# Altium footprint library EwgMicrochips.PcbLib: 61 footprints (part 3 of 4)
Each footprint in its own frame and in the unit in brackets; x right, y up, seen from the top. Pads: shape width x height; smd on the part's side, far side on the other; paste and mask are expansions set on the pad; w line width, h text height; cw(c..) or ccw(c..) is an arc to the next point about the centre after c.
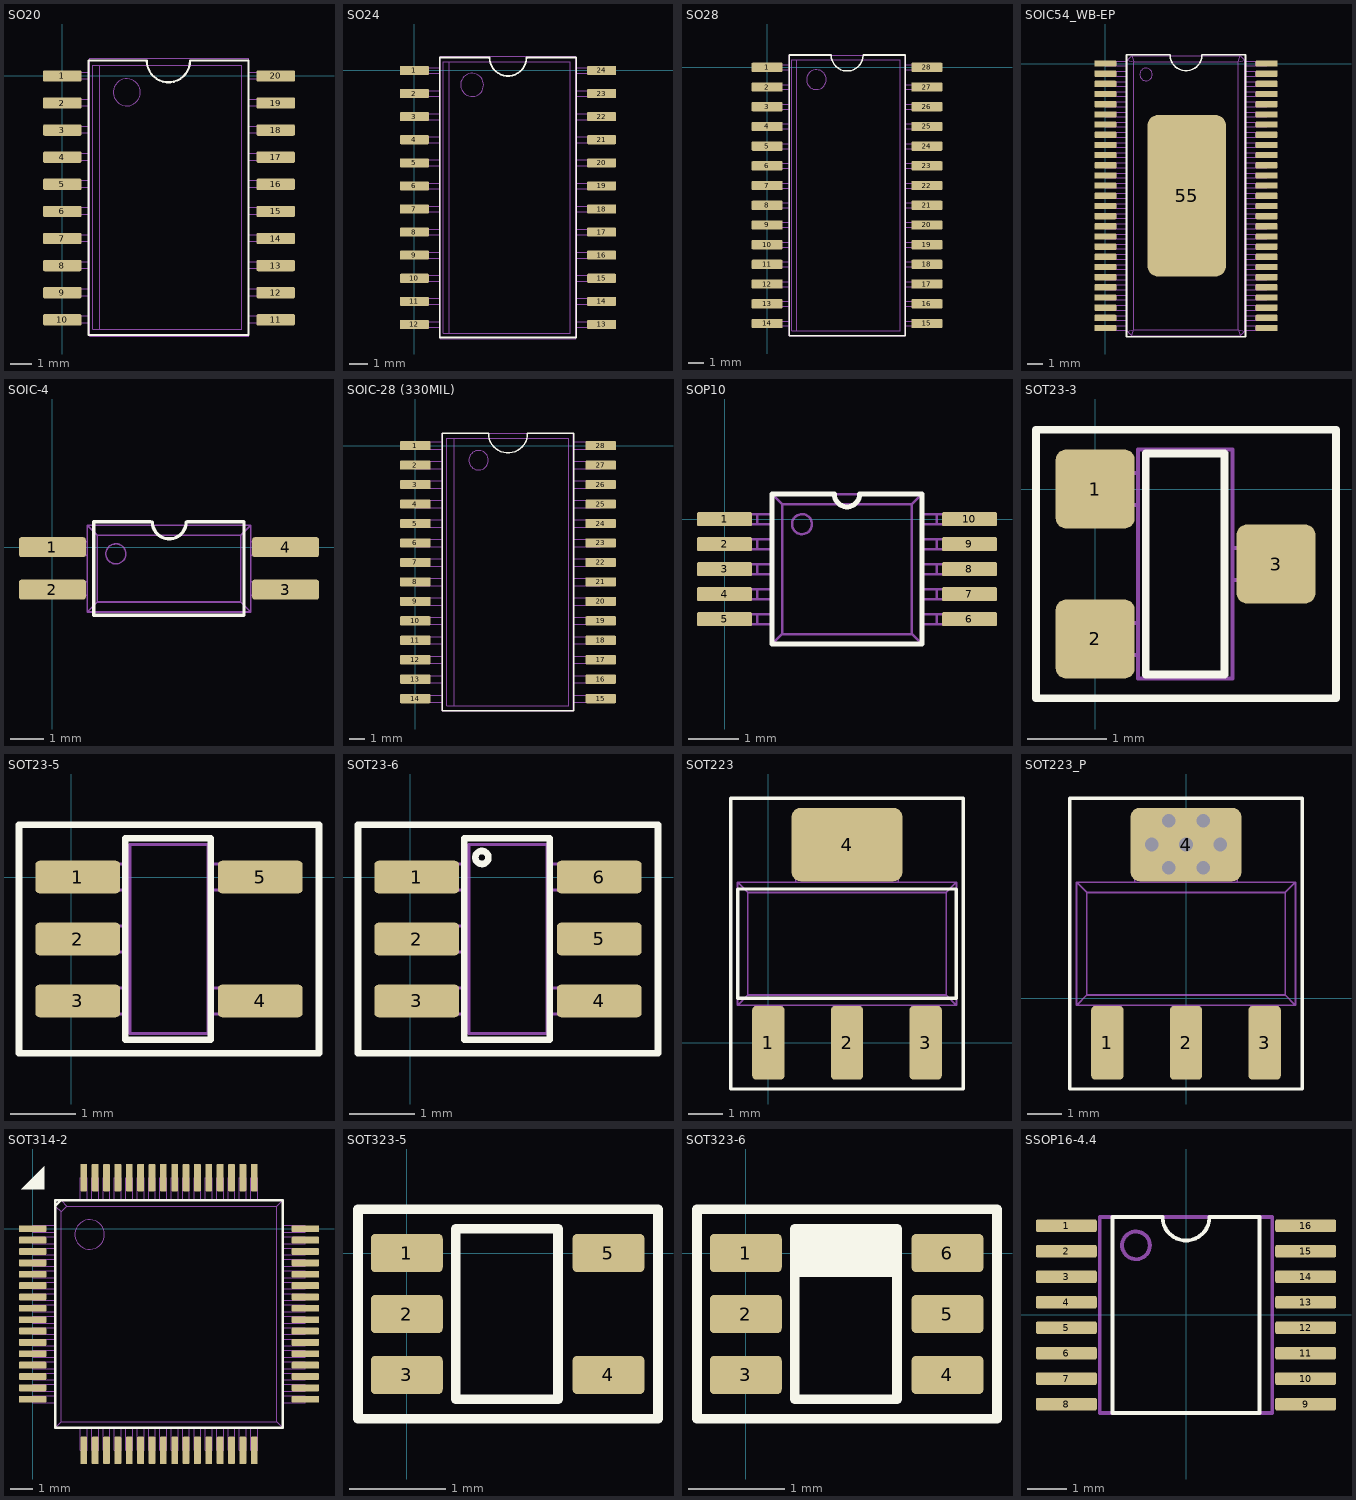
[diagram p2: the footprints below, top view; thin cyan lines are the x and y axes]

## SO20 [mm]
pads (20):
  rrect25% 1.8x0.53 smd: 1(0,0) 2(0,-1.27) 3(0,-2.54) 4(0,-3.81) 5(0,-5.08) 6(0,-6.35) 7(0,-7.62) 8(0,-8.89) 9(0,-10.16) 10(0,-11.43) 11(10,-11.43) 12(10,-10.16) 13(10,-8.89) 14(10,-7.62) 15(10,-6.35) 16(10,-5.08) 17(10,-3.81) 18(10,-2.54) 19(10,-1.27) 20(10,0)
Top Overlay:
  lines w0.1: 1.222,-12.145 8.722,-12.145 8.722,0.715 5.988,0.715 cw(c4.972,0.715) 3.956,0.715 1.222,0.715 1.222,-12.145
Mechanical 1:
  circle w0.05: c3.023,-0.768 r0.635
  lines w0.05: 0.483,-11.563 0.483,-11.246 ; 0.483,-10.293 0.483,-9.976 ; 0.483,-9.023 0.483,-8.706 ; 0.483,-7.753 0.483,-7.436 ; 0.483,-6.483 0.483,-6.166 ; 0.483,-5.213 0.483,-4.896 ; 0.483,-3.943 0.483,-3.626 ; 0.483,-2.673 0.483,-2.356 ; 0.483,-1.403 0.483,-1.086 ; 0.483,-0.133 0.483,0.184 ; 1.276,-11.563 -0.152,-11.563 -0.152,-11.246 1.276,-11.246 ; 1.276,-10.293 -0.152,-10.293 -0.152,-9.976 1.276,-9.976 ; 1.276,-9.023 -0.152,-9.023 -0.152,-8.706 1.276,-8.706 ; 1.276,-7.753 -0.152,-7.753 -0.152,-7.436 1.276,-7.436 ; 1.276,-6.483 -0.152,-6.483 -0.152,-6.166 1.276,-6.166 ; 1.276,-5.213 -0.152,-5.213 -0.152,-4.896 1.276,-4.896 ; 1.276,-3.943 -0.152,-3.943 -0.152,-3.626 1.276,-3.626 ; 1.276,-2.673 -0.152,-2.673 -0.152,-2.356 1.276,-2.356 ; 1.276,-1.403 -0.152,-1.403 -0.152,-1.086 1.276,-1.086 ; 1.276,-0.133 -0.152,-0.133 -0.152,0.184 1.276,0.184 ; 1.753,-11.881 1.753,0.502 ; 8.738,-11.563 10.166,-11.563 10.166,-11.246 8.738,-11.246 ; 8.738,-10.293 10.166,-10.293 10.166,-9.976 8.738,-9.976 ; 8.738,-9.023 10.166,-9.023 10.166,-8.706 8.738,-8.706 ; 8.738,-7.753 10.166,-7.753 10.166,-7.436 8.738,-7.436 ; 8.738,-6.483 10.166,-6.483 10.166,-6.166 8.738,-6.166 ; 8.738,-5.213 10.166,-5.213 10.166,-4.896 8.738,-4.896 ; 8.738,-3.943 10.166,-3.943 10.166,-3.626 8.738,-3.626 ; 8.738,-2.673 10.166,-2.673 10.166,-2.356 8.738,-2.356 ; 8.738,-1.403 10.166,-1.403 10.166,-1.086 8.738,-1.086 ; 8.738,-0.133 10.166,-0.133 10.166,0.184 8.738,0.184 ; 9.531,-11.563 9.531,-11.246 ; 9.531,-10.293 9.531,-9.976 ; 9.531,-9.023 9.531,-8.706 ; 9.531,-7.753 9.531,-7.436 ; 9.531,-6.483 9.531,-6.166 ; 9.531,-5.213 9.531,-4.896 ; 9.531,-3.943 9.531,-3.626 ; 9.531,-2.673 9.531,-2.356 ; 9.531,-1.403 9.531,-1.086 ; 9.531,-0.133 9.531,0.184 ; 1.276,-12.198 8.738,-12.198 8.738,0.819 1.276,0.819 1.276,-12.198 ; 1.435,-11.881 8.42,-11.881 8.42,0.502 1.435,0.502 1.435,-11.881
3D body: height 2.7, standoff 0, extent -0.172,-12.114 10.128,0.686

## SO24 [mm]
pads (24):
  rrect25% 1.6x0.5 smd: 1(0,0) 2(0,-1.27) 3(0,-2.54) 4(0,-3.81) 5(0,-5.08) 6(0,-6.35) 7(0,-7.62) 8(0,-8.89) 9(0,-10.16) 10(0,-11.43) 11(0,-12.7) 12(0,-13.97) 13(10.3,-13.97) 14(10.3,-12.7) 15(10.3,-11.43) 16(10.3,-10.16) 17(10.3,-8.89) 18(10.3,-7.62) 19(10.3,-6.35) 20(10.3,-5.08) 21(10.3,-3.81) 22(10.3,-2.54) 23(10.3,-1.27) 24(10.3,0)
Top Overlay:
  lines w0.1: 1.4,-14.685 1.4,0.715 4.134,0.715 ccw(c5.15,0.715) 6.166,0.715 8.9,0.715 8.9,-14.685 1.4,-14.685
Mechanical 1:
  circle w0.05: c3.175,-0.794 r0.635
  lines w0.05: 0.635,-14.129 0.635,-13.811 ; 0.635,-12.859 0.635,-12.541 ; 0.635,-11.589 0.635,-11.271 ; 0.635,-10.319 0.635,-10.001 ; 0.635,-9.049 0.635,-8.731 ; 0.635,-7.779 0.635,-7.461 ; 0.635,-6.509 0.635,-6.191 ; 0.635,-5.239 0.635,-4.921 ; 0.635,-3.969 0.635,-3.651 ; 0.635,-2.699 0.635,-2.381 ; 0.635,-1.429 0.635,-1.111 ; 0.635,-0.159 0.635,0.159 ; 1.429,-14.129 0,-14.129 0,-13.811 1.429,-13.811 ; 1.429,-12.859 0,-12.859 0,-12.541 1.429,-12.541 ; 1.429,-11.589 0,-11.589 0,-11.271 1.429,-11.271 ; 1.429,-10.319 0,-10.319 0,-10.001 1.429,-10.001 ; 1.429,-9.049 0,-9.049 0,-8.731 1.429,-8.731 ; 1.429,-7.779 0,-7.779 0,-7.461 1.429,-7.461 ; 1.429,-6.509 0,-6.509 0,-6.191 1.429,-6.191 ; 1.429,-5.239 0,-5.239 0,-4.921 1.429,-4.921 ; 1.429,-3.969 0,-3.969 0,-3.651 1.429,-3.651 ; 1.429,-2.699 0,-2.699 0,-2.381 1.429,-2.381 ; 1.429,-1.429 0,-1.429 0,-1.111 1.429,-1.111 ; 1.429,-0.159 0,-0.159 0,0.159 1.429,0.159 ; 1.905,-14.446 1.905,0.476 ; 8.89,-14.129 10.319,-14.129 10.319,-13.811 8.89,-13.811 ; 8.89,-12.859 10.319,-12.859 10.319,-12.541 8.89,-12.541 ; 8.89,-11.589 10.319,-11.589 10.319,-11.271 8.89,-11.271 ; 8.89,-10.319 10.319,-10.319 10.319,-10.001 8.89,-10.001 ; 8.89,-9.049 10.319,-9.049 10.319,-8.731 8.89,-8.731 ; 8.89,-7.779 10.319,-7.779 10.319,-7.461 8.89,-7.461 ; 8.89,-6.509 10.319,-6.509 10.319,-6.191 8.89,-6.191 ; 8.89,-5.239 10.319,-5.239 10.319,-4.921 8.89,-4.921 ; 8.89,-3.969 10.319,-3.969 10.319,-3.651 8.89,-3.651 ; 8.89,-2.699 10.319,-2.699 10.319,-2.381 8.89,-2.381 ; 8.89,-1.429 10.319,-1.429 10.319,-1.111 8.89,-1.111 ; 8.89,-0.159 10.319,-0.159 10.319,0.159 8.89,0.159 ; 9.684,-14.129 9.684,-13.811 ; 9.684,-12.859 9.684,-12.541 ; 9.684,-11.589 9.684,-11.271 ; 9.684,-10.319 9.684,-10.001 ; 9.684,-9.049 9.684,-8.731 ; 9.684,-7.779 9.684,-7.461 ; 9.684,-6.509 9.684,-6.191 ; 9.684,-5.239 9.684,-4.921 ; 9.684,-3.969 9.684,-3.651 ; 9.684,-2.699 9.684,-2.381 ; 9.684,-1.429 9.684,-1.111 ; 9.684,-0.159 9.684,0.159 ; 1.429,-14.764 1.429,0.794 8.89,0.794 8.89,-14.764 1.429,-14.764 ; 1.587,-14.446 1.587,0.476 8.572,0.476 8.572,-14.446 1.587,-14.446
3D body: height 2.6, standoff 0, extent -0.025,-14.8 10.375,0.6

## SO28 [mm]
pads (28):
  rrect25% 2x0.6 smd: 1(0,0) 2(0,-1.27) 3(0,-2.54) 4(0,-3.81) 5(0,-5.08) 6(0,-6.35) 7(0,-7.62) 8(0,-8.89) 9(0,-10.16) 10(0,-11.43) 11(0,-12.7) 12(0,-13.97) 13(0,-15.24) 14(0,-16.51) 15(10.3,-16.51) 16(10.3,-15.24) 17(10.3,-13.97) 18(10.3,-12.7) 19(10.3,-11.43) 20(10.3,-10.16) 21(10.3,-8.89) 22(10.3,-7.62) 23(10.3,-6.35) 24(10.3,-5.08) 25(10.3,-3.81) 26(10.3,-2.54) 27(10.3,-1.27) 28(10.3,0)
Top Overlay:
  lines w0.1: 1.429,-17.304 1.429,0.794 4.127,0.794 ccw(c5.159,0.794) 6.191,0.794 8.89,0.794 8.89,-17.304 1.429,-17.304
Mechanical 1:
  circle w0.05: c3.175,-0.794 r0.635
  lines w0.05: 0.635,-16.669 0.635,-16.351 ; 0.635,-15.399 0.635,-15.081 ; 0.635,-14.129 0.635,-13.811 ; 0.635,-12.859 0.635,-12.541 ; 0.635,-11.589 0.635,-11.271 ; 0.635,-10.319 0.635,-10.001 ; 0.635,-9.049 0.635,-8.731 ; 0.635,-7.779 0.635,-7.461 ; 0.635,-6.509 0.635,-6.191 ; 0.635,-5.239 0.635,-4.921 ; 0.635,-3.969 0.635,-3.651 ; 0.635,-2.699 0.635,-2.381 ; 0.635,-1.429 0.635,-1.111 ; 0.635,-0.159 0.635,0.159 ; 1.429,-16.669 0,-16.669 0,-16.351 1.429,-16.351 ; 1.429,-15.399 0,-15.399 0,-15.081 1.429,-15.081 ; 1.429,-14.129 0,-14.129 0,-13.811 1.429,-13.811 ; 1.429,-12.859 0,-12.859 0,-12.541 1.429,-12.541 ; 1.429,-11.589 0,-11.589 0,-11.271 1.429,-11.271 ; 1.429,-10.319 0,-10.319 0,-10.001 1.429,-10.001 ; 1.429,-9.049 0,-9.049 0,-8.731 1.429,-8.731 ; 1.429,-7.779 0,-7.779 0,-7.461 1.429,-7.461 ; 1.429,-6.509 0,-6.509 0,-6.191 1.429,-6.191 ; 1.429,-5.239 0,-5.239 0,-4.921 1.429,-4.921 ; 1.429,-3.969 0,-3.969 0,-3.651 1.429,-3.651 ; 1.429,-2.699 0,-2.699 0,-2.381 1.429,-2.381 ; 1.429,-1.429 0,-1.429 0,-1.111 1.429,-1.111 ; 1.429,-0.159 0,-0.159 0,0.159 1.429,0.159 ; 1.905,-16.986 1.905,0.476 ; 8.89,-16.669 10.319,-16.669 10.319,-16.351 8.89,-16.351 ; 8.89,-15.399 10.319,-15.399 10.319,-15.081 8.89,-15.081 ; 8.89,-14.129 10.319,-14.129 10.319,-13.811 8.89,-13.811 ; 8.89,-12.859 10.319,-12.859 10.319,-12.541 8.89,-12.541 ; 8.89,-11.589 10.319,-11.589 10.319,-11.271 8.89,-11.271 ; 8.89,-10.319 10.319,-10.319 10.319,-10.001 8.89,-10.001 ; 8.89,-9.049 10.319,-9.049 10.319,-8.731 8.89,-8.731 ; 8.89,-7.779 10.319,-7.779 10.319,-7.461 8.89,-7.461 ; 8.89,-6.509 10.319,-6.509 10.319,-6.191 8.89,-6.191 ; 8.89,-5.239 10.319,-5.239 10.319,-4.921 8.89,-4.921 ; 8.89,-3.969 10.319,-3.969 10.319,-3.651 8.89,-3.651 ; 8.89,-2.699 10.319,-2.699 10.319,-2.381 8.89,-2.381 ; 8.89,-1.429 10.319,-1.429 10.319,-1.111 8.89,-1.111 ; 8.89,-0.159 10.319,-0.159 10.319,0.159 8.89,0.159 ; 9.684,-16.669 9.684,-16.351 ; 9.684,-15.399 9.684,-15.081 ; 9.684,-14.129 9.684,-13.811 ; 9.684,-12.859 9.684,-12.541 ; 9.684,-11.589 9.684,-11.271 ; 9.684,-10.319 9.684,-10.001 ; 9.684,-9.049 9.684,-8.731 ; 9.684,-7.779 9.684,-7.461 ; 9.684,-6.509 9.684,-6.191 ; 9.684,-5.239 9.684,-4.921 ; 9.684,-3.969 9.684,-3.651 ; 9.684,-2.699 9.684,-2.381 ; 9.684,-1.429 9.684,-1.111 ; 9.684,-0.159 9.684,0.159 ; 1.429,-17.304 1.429,0.794 8.89,0.794 8.89,-17.304 1.429,-17.304 ; 1.587,-16.986 1.587,0.476 8.572,0.476 8.572,-16.986 1.587,-16.986

## SOIC54_WB-EP [mm]
pads (55):
  rrect25% 1.4x0.4 smd: 1(0,0) 2(0,-0.65) 3(0,-1.3) 4(0,-1.95) 5(0,-2.6) 6(0,-3.25) 7(0,-3.9) 8(0,-4.55) 9(0,-5.2) 10(0,-5.85) 11(0,-6.5) 12(0,-7.15) 13(0,-7.8) 14(0,-8.45) 15(0,-9.1) 16(0,-9.75) 17(0,-10.4) 18(0,-11.05) 19(0,-11.7) 20(0,-12.35) 21(0,-13) 22(0,-13.65) 23(0,-14.3) 24(0,-14.95) 25(0,-15.6) 26(0,-16.25) 27(0,-16.9) 28(10.3,-16.9) 29(10.3,-16.25) 30(10.3,-15.6) 31(10.3,-14.95) 32(10.3,-14.3) 33(10.3,-13.65) 34(10.3,-13) 35(10.3,-12.35) 36(10.3,-11.7) 37(10.3,-11.05) 38(10.3,-10.4) 39(10.3,-9.75) 40(10.3,-9.1) 41(10.3,-8.45) 42(10.3,-7.8) 43(10.3,-7.15) 44(10.3,-6.5) 45(10.3,-5.85) 46(10.3,-5.2) 47(10.3,-4.55) 48(10.3,-3.9) 49(10.3,-3.25) 50(10.3,-2.6) 51(10.3,-1.95) 52(10.3,-1.3) 53(10.3,-0.65) 54(10.3,0)
  rrect25% 5x10.3 smd: 55(5.2,-8.45)
Top Overlay:
  lines w0.1: 1.35,-17.45 8.95,-17.45 8.95,0.55 6.166,0.55 cw(c5.15,0.55) 4.134,0.55 1.35,0.55 1.35,-17.45
Mechanical 1:
  drawing of 238 lines, arcs and shapes, not listed

## SOIC-4 [mm]
pads (4):
  rrect25% 2x0.6 smd: 1(0,0) 2(0,-1.27) 3(6.985,-1.27) 4(6.985,0)
Top Overlay:
  lines w0.1: 2.94,0.76 1.24,0.76 1.24,-2.04 5.74,-2.04 5.74,0.76 4.04,0.76 ; 2.992,0.755 ccw(c3.5,0.755) 4.008,0.755
Mechanical 1:
  circle w0.05: c1.9,-0.2 r0.3
  lines w0.05: 0.54,-1.44 0.54,-1.04 ; 0.54,-0.24 0.54,0.16 ; 1.04,-1.44 -0.06,-1.44 -0.06,-1.04 1.04,-1.04 ; 1.04,-0.24 -0.06,-0.24 -0.06,0.16 1.04,0.16 ; 5.94,-1.44 7.04,-1.44 7.04,-1.04 5.94,-1.04 ; 5.94,-0.24 7.04,-0.24 7.04,0.16 5.94,0.16 ; 6.44,-1.44 6.44,-1.04 ; 6.44,-0.24 6.44,0.16 ; 1.04,-1.94 1.04,0.66 ; 1.04,-1.94 1.34,-1.64 ; 1.04,-1.94 5.94,-1.94 ; 1.04,0.66 1.34,0.36 ; 1.04,0.66 5.94,0.66 ; 1.34,-1.64 1.34,0.36 ; 1.34,-1.64 5.64,-1.64 ; 1.34,0.36 5.64,0.36 ; 5.64,-1.64 5.64,0.36 ; 5.64,-1.64 5.94,-1.94 ; 5.64,0.36 5.94,0.66 ; 5.94,-1.94 5.94,0.66
3D body: height 1.7, standoff -0.05, extent 0.4,-1.85 6.6,0.5

## SOIC-28 (330MIL) [mm]
pads (28):
  rrect25% 2x0.6 smd: 1(0,0) 2(0,-1.27) 3(0,-2.54) 4(0,-3.81) 5(0,-5.08) 6(0,-6.35) 7(0,-7.62) 8(0,-8.89) 9(0,-10.16) 10(0,-11.43) 11(0,-12.7) 12(0,-13.97) 13(0,-15.24) 14(0,-16.51) 15(12.1,-16.51) 16(12.1,-15.24) 17(12.1,-13.97) 18(12.1,-12.7) 19(12.1,-11.43) 20(12.1,-10.16) 21(12.1,-8.89) 22(12.1,-7.62) 23(12.1,-6.35) 24(12.1,-5.08) 25(12.1,-3.81) 26(12.1,-2.54) 27(12.1,-1.27) 28(12.1,0)
Top Overlay:
  lines w0.1: 1.775,-17.305 10.325,-17.305 10.325,0.795 7.32,0.795 cw(c6.05,0.795) 4.78,0.795 1.775,0.795 1.775,-17.305
Mechanical 1:
  circle w0.05: c4.127,-0.953 r0.635
  lines w0.05: 0.873,-16.748 0.873,-16.272 ; 0.873,-15.478 0.873,-15.002 ; 0.873,-14.208 0.873,-13.732 ; 0.873,-12.938 0.873,-12.462 ; 0.873,-11.668 0.873,-11.192 ; 0.873,-10.398 0.873,-9.922 ; 0.873,-9.128 0.873,-8.652 ; 0.873,-7.858 0.873,-7.382 ; 0.873,-6.588 0.873,-6.112 ; 0.873,-5.318 0.873,-4.842 ; 0.873,-4.048 0.873,-3.572 ; 0.873,-2.778 0.873,-2.302 ; 0.873,-1.508 0.873,-1.032 ; 0.873,-0.238 0.873,0.238 ; 1.746,-16.748 0,-16.748 0,-16.272 1.746,-16.272 ; 1.746,-15.478 0,-15.478 0,-15.002 1.746,-15.002 ; 1.746,-14.208 0,-14.208 0,-13.732 1.746,-13.732 ; 1.746,-12.938 0,-12.938 0,-12.462 1.746,-12.462 ; 1.746,-11.668 0,-11.668 0,-11.192 1.746,-11.192 ; 1.746,-10.398 0,-10.398 0,-9.922 1.746,-9.922 ; 1.746,-9.128 0,-9.128 0,-8.652 1.746,-8.652 ; 1.746,-7.858 0,-7.858 0,-7.382 1.746,-7.382 ; 1.746,-6.588 0,-6.588 0,-6.112 1.746,-6.112 ; 1.746,-5.318 0,-5.318 0,-4.842 1.746,-4.842 ; 1.746,-4.048 0,-4.048 0,-3.572 1.746,-3.572 ; 1.746,-2.778 0,-2.778 0,-2.302 1.746,-2.302 ; 1.746,-1.508 0,-1.508 0,-1.032 1.746,-1.032 ; 1.746,-0.238 0,-0.238 0,0.238 1.746,0.238 ; 2.54,-16.986 2.54,0.476 ; 10.319,-16.748 12.066,-16.748 12.066,-16.272 10.319,-16.272 ; 10.319,-15.478 12.066,-15.478 12.066,-15.002 10.319,-15.002 ; 10.319,-14.208 12.066,-14.208 12.066,-13.732 10.319,-13.732 ; 10.319,-12.938 12.066,-12.938 12.066,-12.462 10.319,-12.462 ; 10.319,-11.668 12.066,-11.668 12.066,-11.192 10.319,-11.192 ; 10.319,-10.398 12.066,-10.398 12.066,-9.922 10.319,-9.922 ; 10.319,-9.128 12.066,-9.128 12.066,-8.652 10.319,-8.652 ; 10.319,-7.858 12.066,-7.858 12.066,-7.382 10.319,-7.382 ; 10.319,-6.588 12.066,-6.588 12.066,-6.112 10.319,-6.112 ; 10.319,-5.318 12.066,-5.318 12.066,-4.842 10.319,-4.842 ; 10.319,-4.048 12.066,-4.048 12.066,-3.572 10.319,-3.572 ; 10.319,-2.778 12.066,-2.778 12.066,-2.302 10.319,-2.302 ; 10.319,-1.508 12.066,-1.508 12.066,-1.032 10.319,-1.032 ; 10.319,-0.238 12.066,-0.238 12.066,0.238 10.319,0.238 ; 11.193,-16.748 11.193,-16.272 ; 11.193,-15.478 11.193,-15.002 ; 11.193,-14.208 11.193,-13.732 ; 11.193,-12.938 11.193,-12.462 ; 11.193,-11.668 11.193,-11.192 ; 11.193,-10.398 11.193,-9.922 ; 11.193,-9.128 11.193,-8.652 ; 11.193,-7.858 11.193,-7.382 ; 11.193,-6.588 11.193,-6.112 ; 11.193,-5.318 11.193,-4.842 ; 11.193,-4.048 11.193,-3.572 ; 11.193,-2.778 11.193,-2.302 ; 11.193,-1.508 11.193,-1.032 ; 11.193,-0.238 11.193,0.238 ; 1.746,-17.304 10.319,-17.304 10.319,0.794 1.746,0.794 1.746,-17.304 ; 2.064,-16.986 10.001,-16.986 10.001,0.476 2.064,0.476 2.064,-16.986

## SOP10 [mm]
pads (10):
  rrect25% 1.1x0.28 smd: 1(0,0) 2(0,-0.5) 3(0,-1) 4(0,-1.5) 5(0,-2) 6(4.9,-2) 7(4.9,-1.5) 8(4.9,-1) 9(4.9,-0.5) 10(4.9,0)
Top Overlay:
  lines w0.1: 0.95,-2.5 0.95,0.5 2.196,0.5 ccw(c2.45,0.5) 2.704,0.5 3.95,0.5 3.95,-2.5 0.95,-2.5
Mechanical 1:
  circle w0.05: c1.55,-0.1 r0.2
  lines w0.05: 0.25,-2.1 0.25,-1.9 ; 0.25,-1.6 0.25,-1.4 ; 0.25,-1.1 0.25,-0.9 ; 0.25,-0.6 0.25,-0.4 ; 0.25,-0.1 0.25,0.1 ; 0.65,-2.1 0.65,-1.9 ; 0.65,-1.6 0.65,-1.4 ; 0.65,-1.1 0.65,-0.9 ; 0.65,-0.6 0.65,-0.4 ; 0.65,-0.1 0.65,0.1 ; 0.95,-2.1 -0.05,-2.1 -0.05,-1.9 0.95,-1.9 ; 0.95,-1.6 -0.05,-1.6 -0.05,-1.4 0.95,-1.4 ; 0.95,-1.1 -0.05,-1.1 -0.05,-0.9 0.95,-0.9 ; 0.95,-0.6 -0.05,-0.6 -0.05,-0.4 0.95,-0.4 ; 0.95,-0.1 -0.05,-0.1 -0.05,0.1 0.95,0.1 ; 3.95,-2.1 4.95,-2.1 4.95,-1.9 3.95,-1.9 ; 3.95,-1.6 4.95,-1.6 4.95,-1.4 3.95,-1.4 ; 3.95,-1.1 4.95,-1.1 4.95,-0.9 3.95,-0.9 ; 3.95,-0.6 4.95,-0.6 4.95,-0.4 3.95,-0.4 ; 3.95,-0.1 4.95,-0.1 4.95,0.1 3.95,0.1 ; 4.25,-2.1 4.25,-1.9 ; 4.25,-1.6 4.25,-1.4 ; 4.25,-1.1 4.25,-0.9 ; 4.25,-0.6 4.25,-0.4 ; 4.25,-0.1 4.25,0.1 ; 4.65,-2.1 4.65,-1.9 ; 4.65,-1.6 4.65,-1.4 ; 4.65,-1.1 4.65,-0.9 ; 4.65,-0.6 4.65,-0.4 ; 4.65,-0.1 4.65,0.1 ; 0.95,-2.5 1.15,-2.3 ; 0.95,-2.5 0.95,0.5 ; 0.95,-2.5 3.95,-2.5 ; 0.95,0.5 1.15,0.3 ; 0.95,0.5 3.95,0.5 ; 1.15,-2.3 1.15,0.3 ; 1.15,-2.3 3.75,-2.3 ; 1.15,0.3 3.75,0.3 ; 3.75,-2.3 3.95,-2.5 ; 3.75,-2.3 3.75,0.3 ; 3.75,0.3 3.95,0.5 ; 3.95,-2.5 3.95,0.5

## SOT23-3 [mm]
pads (3):
  rrect25% 1x1 smd: 1(0,0) 2(0,-1.9) 3(2.29,-0.95)
Top Overlay:
  lines w0.1: -0.75,-2.65 -0.75,0.75 3.05,0.75 3.05,-2.65 -0.75,-2.65 ; 0.64,-2.35 1.64,-2.35 1.64,0.45 0.64,0.45 0.64,-2.35
Mechanical 1:
  lines w0.05: 0.24,-2.1 0.24,-1.7 ; 0.24,-0.2 0.24,0.2 ; 0.54,-2.1 0.04,-2.1 0.04,-1.7 0.54,-1.7 ; 0.54,-0.2 0.04,-0.2 0.04,0.2 0.54,0.2 ; 1.74,-1.15 2.24,-1.15 2.24,-0.75 1.74,-0.75 ; 2.04,-1.15 2.04,-0.75 ; 0.54,-2.4 1.74,-2.4 1.74,0.5 0.54,0.5 0.54,-2.4
3D body: height 0.97, standoff -0.01, extent -0.13,-2.435 2.418,0.485

## SOT23-5 [mm]
pads (5):
  rrect25% 1.3x0.5 smd mask+0.05: 1(0.1,0) 2(0.1,-0.95) 3(0.1,-1.9) 4(2.9,-1.9) 5(2.9,0)
Top Overlay:
  lines w0.1: -0.8,-2.7 3.8,-2.7 3.8,0.8 -0.8,0.8 -0.8,-2.7 ; 0.831,-2.494 0.831,0.594 2.137,0.594 2.137,-2.494 0.831,-2.494
Mechanical 1:
  lines w0.05: 0.596,-2.1 0.596,-1.7 ; 0.596,-1.15 0.596,-0.75 ; 0.596,-0.2 0.596,0.2 ; 0.896,-2.1 0.396,-2.1 0.396,-1.7 0.896,-1.7 ; 0.896,-1.15 0.396,-1.15 0.396,-0.75 0.896,-0.75 ; 0.896,-0.2 0.396,-0.2 0.396,0.2 0.896,0.2 ; 2.096,-2.1 2.596,-2.1 2.596,-1.7 2.096,-1.7 ; 2.096,-0.2 2.596,-0.2 2.596,0.2 2.096,0.2 ; 2.396,-2.1 2.396,-1.7 ; 2.396,-0.2 2.396,0.2 ; 0.896,-2.4 0.896,0.5 2.096,0.5 2.096,-2.4 0.896,-2.4
3D body: height 1.45, standoff -0.01, extent 0,-2.45 3,0.55

## SOT23-6 [mm]
pads (6):
  rrect25% 1.3x0.5 smd mask+0.05: 1(0.1,0) 2(0.1,-0.95) 3(0.1,-1.9) 4(2.9,-1.9) 5(2.9,-0.95) 6(2.9,0)
Top Overlay:
  circle w0.1: c1.1,0.3 r0.1
  lines w0.1: -0.8,-2.7 3.8,-2.7 3.8,0.8 -0.8,0.8 -0.8,-2.7 ; 0.831,-2.494 0.831,0.594 2.137,0.594 2.137,-2.494 0.831,-2.494
Mechanical 1:
  lines w0.05: 0.596,-2.1 0.596,-1.7 ; 0.596,-1.15 0.596,-0.75 ; 0.596,-0.2 0.596,0.2 ; 0.896,-2.1 0.396,-2.1 0.396,-1.7 0.896,-1.7 ; 0.896,-1.15 0.396,-1.15 0.396,-0.75 0.896,-0.75 ; 0.896,-0.2 0.396,-0.2 0.396,0.2 0.896,0.2 ; 2.096,-2.1 2.596,-2.1 2.596,-1.7 2.096,-1.7 ; 2.096,-0.2 2.596,-0.2 2.596,0.2 2.096,0.2 ; 2.396,-2.1 2.396,-1.7 ; 2.396,-0.2 2.396,0.2 ; 0.896,-2.4 0.896,0.5 2.096,0.5 2.096,-2.4 0.896,-2.4
3D body: height 1.4, standoff 0, extent -0.016,-2.494 2.984,0.554

## SOT223 [mm]
pads (4):
  rrect25% 0.95x2.15 smd: 1(0,0) 2(2.3,0) 3(4.6,0)
  rrect25% 3.25x2.15 smd: 4(2.3,5.8)
Top Overlay:
  lines w0.1: -1.1,-1.35 -1.1,7.15 5.7,7.15 5.7,-1.35 -1.1,-1.35 ; -0.9,1.3 5.5,1.3 5.5,4.5 -0.9,4.5 -0.9,1.3
Mechanical 1:
  lines w0.05: -0.4,0 0.4,0 ; -0.4,1.1 -0.4,-0.6 0.4,-0.6 0.4,1.1 ; 0.8,4.7 0.8,6.4 3.8,6.4 3.8,4.7 ; 0.8,5.6 3.8,5.6 ; 1.9,0 2.7,0 ; 1.9,1.1 1.9,-0.6 2.7,-0.6 2.7,1.1 ; 4.2,0 5,0 ; 4.2,1.1 4.2,-0.6 5,-0.6 5,1.1 ; -0.9,1.1 5.5,1.1 ; -0.9,1.1 -0.6,1.4 ; -0.9,1.1 -0.9,4.7 ; -0.9,4.7 5.5,4.7 ; -0.9,4.7 -0.6,4.4 ; -0.6,1.4 5.2,1.4 ; -0.6,1.4 -0.6,4.4 ; -0.6,4.4 5.2,4.4 ; 5.2,1.4 5.5,1.1 ; 5.2,1.4 5.2,4.4 ; 5.2,4.4 5.5,4.7 ; 5.5,1.1 5.5,4.7
3D body: height 1.64, standoff -0.01, extent -0.94,-0.6 5.56,6.4

## SOT223_P [mm]
pads (4):
  rrect25% 0.95x2.15 smd: 1(-2.3,-1.3) 2(0,-1.3) 3(2.3,-1.3)
  rrect25% 3.25x2.15 hole 0.4: 4(0,4.5)
via -0.5,3.825 diameter 0.7 hole 0.4
via 0.5,3.825 diameter 0.7 hole 0.4
via -1,4.5 diameter 0.7 hole 0.4
via 1,4.5 diameter 0.7 hole 0.4
via -0.5,5.2 diameter 0.7 hole 0.4
via 0.5,5.2 diameter 0.7 hole 0.4
Top Overlay:
  lines w0.1: -3.4,-2.65 -3.4,5.85 3.4,5.85 3.4,-2.65 -3.4,-2.65
Mechanical 1:
  lines w0.05: -2.7,-1.3 -1.9,-1.3 ; -2.7,-0.2 -2.7,-1.9 -1.9,-1.9 -1.9,-0.2 ; -1.5,3.4 -1.5,5.1 1.5,5.1 1.5,3.4 ; -1.5,4.3 1.5,4.3 ; -0.4,-1.3 0.4,-1.3 ; -0.4,-0.2 -0.4,-1.9 0.4,-1.9 0.4,-0.2 ; 1.9,-1.3 2.7,-1.3 ; 1.9,-0.2 1.9,-1.9 2.7,-1.9 2.7,-0.2 ; -3.2,-0.2 3.2,-0.2 ; -3.2,-0.2 -2.9,0.1 ; -3.2,-0.2 -3.2,3.4 ; -3.2,3.4 3.2,3.4 ; -3.2,3.4 -2.9,3.1 ; -2.9,0.1 2.9,0.1 ; -2.9,0.1 -2.9,3.1 ; -2.9,3.1 2.9,3.1 ; 2.9,0.1 3.2,-0.2 ; 2.9,0.1 2.9,3.1 ; 2.9,3.1 3.2,3.4 ; 3.2,-0.2 3.2,3.4
3D body: height 1.64, standoff -0.01, extent -3.24,-1.9 3.26,5.1

## SOT314-2 [mm]
pads (64):
  rrect25% 1.2x0.3 smd: 1(0,0) 2(0,-0.5) 3(0,-1) 4(0,-1.5) 5(0,-2) 6(0,-2.5) 7(0,-3) 8(0,-3.5) 9(0,-4) 10(0,-4.5) 11(0,-5) 12(0,-5.5) 13(0,-6) 14(0,-6.5) 15(0,-7) 16(0,-7.5) 33(12,-7.5) 34(12,-7) 35(12,-6.5) 36(12,-6) 37(12,-5.5) 38(12,-5) 39(12,-4.5) 40(12,-4) 41(12,-3.5) 42(12,-3) 43(12,-2.5) 44(12,-2) 45(12,-1.5) 46(12,-1) 47(12,-0.5) 48(12,0)
  rrect25% 0.3x1.2 smd: 17(2.25,-9.75) 18(2.75,-9.75) 19(3.25,-9.75) 20(3.75,-9.75) 21(4.25,-9.75) 22(4.75,-9.75) 23(5.25,-9.75) 24(5.75,-9.75) 25(6.25,-9.75) 26(6.75,-9.75) 27(7.25,-9.75) 28(7.75,-9.75) 29(8.25,-9.75) 30(8.75,-9.75) 31(9.25,-9.75) 32(9.75,-9.75) 49(9.75,2.25) 50(9.25,2.25) 51(8.75,2.25) 52(8.25,2.25) 53(7.75,2.25) 54(7.25,2.25) 55(6.75,2.25) 56(6.25,2.25) 57(5.75,2.25) 58(5.25,2.25) 59(4.75,2.25) 60(4.25,2.25) 61(3.75,2.25) 62(3.25,2.25) 63(2.75,2.25) 64(2.25,2.25)
Top Overlay:
  region: 0.5,1.75 0.5,2.75 -0.5,1.75
  lines w0.1: 1,1 1.25,1.25 ; 1,-8.75 1,1.25 11,1.25 11,-8.75 1,-8.75
Mechanical 1:
  drawing of 208 lines, arcs and shapes, not listed
3D body: height 1.5, standoff -0.07, extent -0.6,-10.35 12.6,2.85

## SOT323-5 [mm]
pads (5):
  rrect25% 0.75x0.4 smd mask+0.05: 1(0,0) 2(0,-0.635) 3(0,-1.27) 4(2.1,-1.27) 5(2.1,0)
Top Overlay:
  lines w0.1: -0.508,-1.727 -0.508,0.457 2.616,0.457 2.616,-1.727 -0.508,-1.727 ; 0.508,-1.524 1.575,-1.524 1.575,0.254 0.508,0.254 0.508,-1.524
3D body: height 0.95, standoff 0, extent -0.009,-1.644 2.091,0.356

## SOT323-6 [mm]
pads (6):
  rrect25% 0.75x0.4 smd mask+0.05: 1(0,0) 2(0,-0.635) 3(0,-1.27) 4(2.1,-1.27) 5(2.1,-0.635) 6(2.1,0)
Top Overlay:
  rectangle: 0.508,-0.25 1.575,0.254
  lines w0.1: -0.508,-1.727 -0.508,0.457 2.616,0.457 2.616,-1.727 -0.508,-1.727 ; 0.508,-1.524 1.575,-1.524 1.575,0.254 0.508,0.254 0.508,-1.524
3D body: height 0.95, standoff 0, extent -0.009,-1.644 2.091,0.356

## SSOP16-4.4 [mm]
pads (16):
  rrect25% 1.55x0.32 smd: 1(-3.05,2.275) 2(-3.05,1.625) 3(-3.05,0.975) 4(-3.05,0.325) 5(-3.05,-0.325) 6(-3.05,-0.975) 7(-3.05,-1.625) 8(-3.05,-2.275) 9(3.05,-2.275) 10(3.05,-1.625) 11(3.05,-0.975) 12(3.05,-0.325) 13(3.05,0.325) 14(3.05,0.975) 15(3.05,1.625) 16(3.05,2.275)
Top Overlay:
  lines w0.1: -1.875,-2.5 -1.875,2.5 -0.6,2.5 ccw(c0,2.5) 0.6,2.5 1.875,2.5 1.875,-2.5 -1.875,-2.5
Mechanical 1:
  circle w0.1: c-1.275,1.775 r0.354
  lines w0.1: -2.2,2.5 -2.2,0 -2.2,-2.5 0,-2.5 2.2,-2.5 2.2,0 2.2,2.5 0,2.5 ; -2.2,2.5 0,2.5 ; -2.2,2.5 0,2.5
3D body: height 1.1, standoff 0, extent -3.2,-2.5 3.2,2.5